# Altium footprint library mastermind.PCBLIB: 1061 footprints (part 39 of 67)
Each footprint in its own frame and in the unit in brackets; x right, y up, seen from the top. Pads: shape width x height; smd on the part's side, far side on the other; paste and mask are expansions set on the pad; w line width, h text height; cw(c..) or ccw(c..) is an arc to the next point about the centre after c.
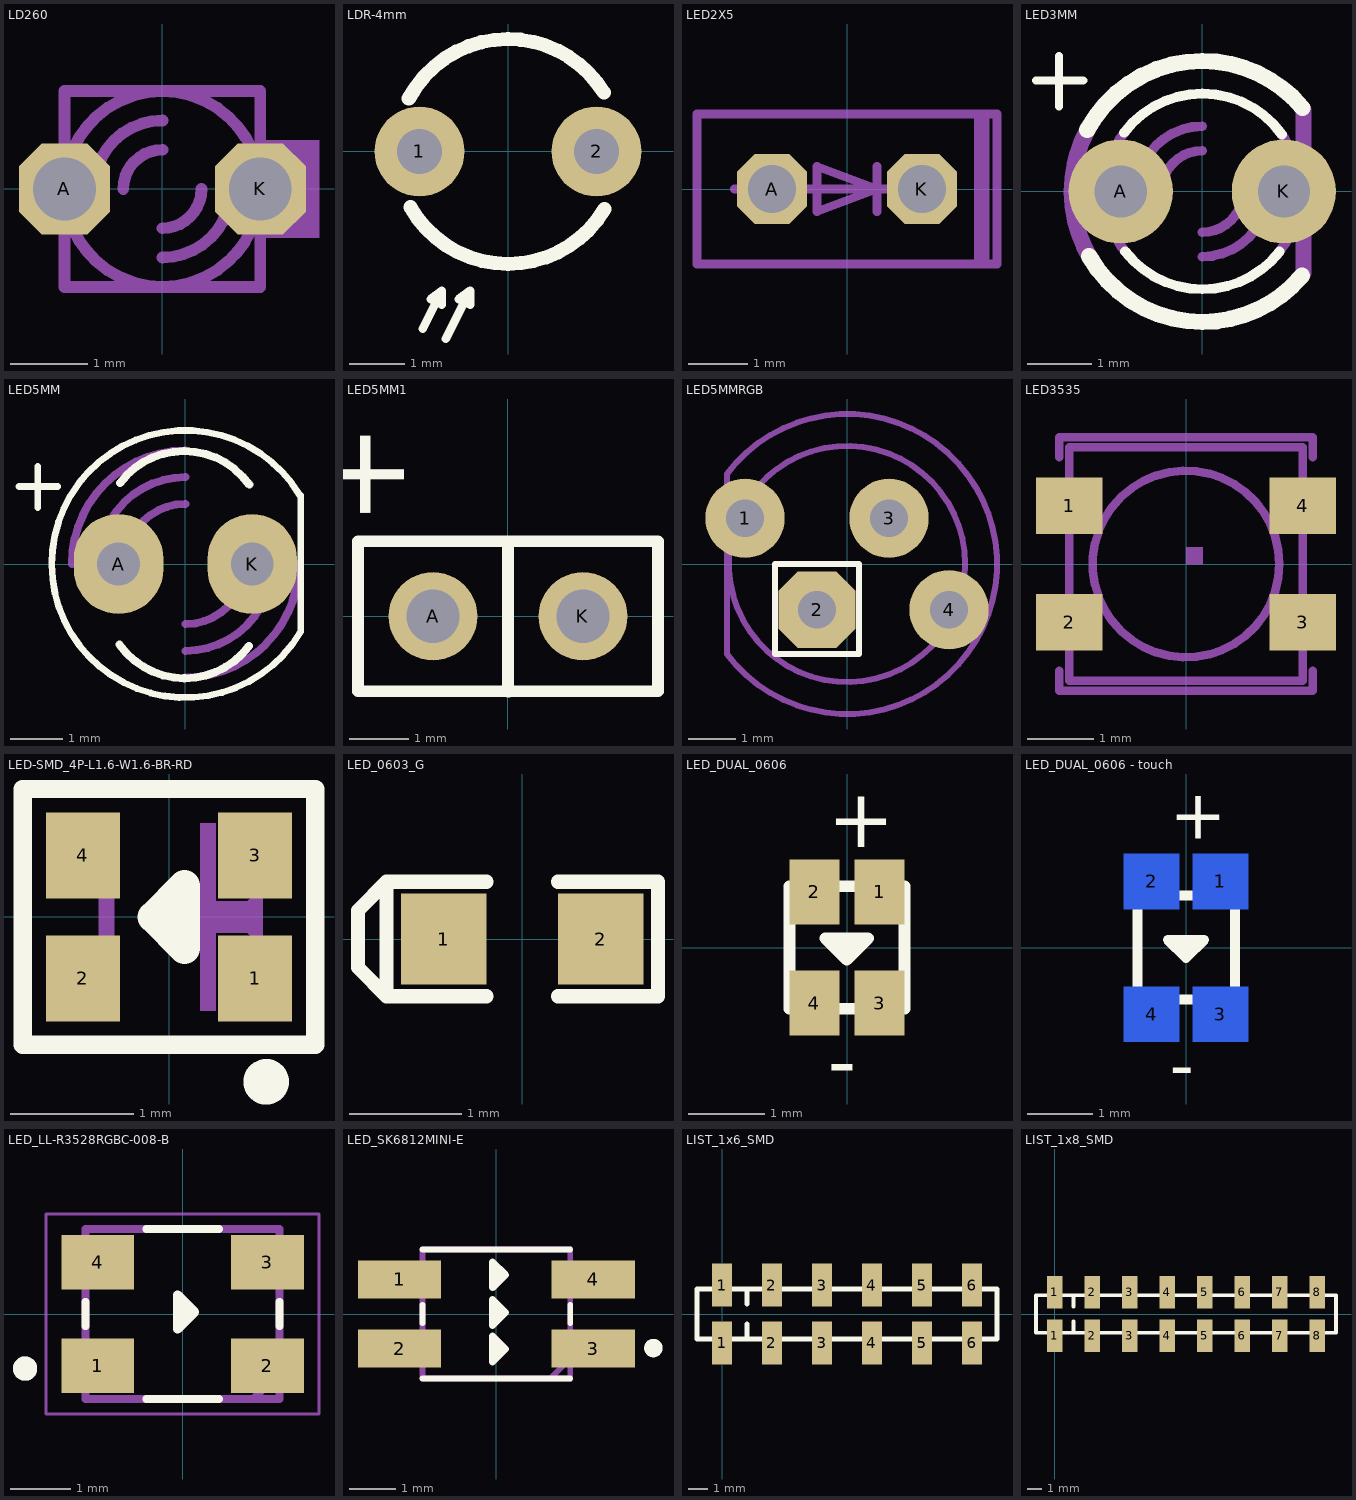
[diagram p38: the footprints below, top view; thin cyan lines are the x and y axes]

## LD260 [mil]
pads (2):
  oct 46.48x46.48 hole 32: A(-50,0) K(50,0)
Mechanical 2:
  region: 75,-25 75,25 80,25 80,-25
  lines w6: -50,-35 -50,-50 50,-50 50,-35 ; -50,35 -50,50 50,50 50,35 ; -39.04,-31.24 ccw(c0,-0.01) 0,-50 ccw(c0,-0.01) 39.04,-31.24 ; -39.04,31.24 cw(c0,0.01) 0,50 cw(c0,0.01) 39.04,31.24 ; 0,-20 ccw(c0,0) 20,0
Mechanical 8:
  region: 50,-25 50,25 80,25 80,-25
  lines w6: -50,-35 -50,35 ; -37.96,-32.54 cw(c0,0) -50,0 cw(c0,0) -37.96,32.54 ; -35,0 cw(c0,0) 0,35 ; -20,0 cw(c0,0) 0,20 ; 0,-35 ccw(c0,0) 35,0 ; 37.63,-32.93 ccw(c-0.01,0) 50,0 ccw(c0,0) 38.41,32.01 ; 50,-35 50,35

## LDR-4mm [mm]
pads (2):
  round 1.623 hole 0.813: 1(-1.6,0) 2(1.6,0)
Top Overlay:
  lines w0.152: -1.539,-3.205 -1.194,-2.515 ; -1.123,-3.388 -0.686,-2.515 ; -1.194,-2.515 -1.397,-2.667 -1.194,-2.769 -1.194,-2.515 ; -0.686,-2.515 -0.686,-2.769 -0.889,-2.667 -0.686,-2.515
  lines w0.254: -1.793,0.956 cw(c0,0) 0,2.032 cw(c0,0) 1.732,1.064 ; -1.764,-1.008 ccw(c0,0) 0,-2.032 ccw(c0,0) 1.745,-1.042

## LED2X5 [mil]
pads (2):
  oct 46.48x46.48 hole 32: A(-50,0) K(50,0)
Mechanical 2:
  region: 85,-50 85,50 95,50 95,-50
  lines w6: -100,-50 100,-50 100,50 -100,50 -100,-50
Mechanical 8:
  lines w6: -75,0 20,0 ; 20,-15 20,0 ; 20,15 20,0 ; 70,0 20,0 ; 20,0 -20,15 -20,-15 20,0

## LED3MM [mil]
pads (2):
  round 63.9 hole 32: A(-50,0) K(50,0)
Top Overlay:
  lines w5: -102,68 -73,68 ; -88,52 -88,83
  lines w6: -48,36 cw(c0,0) 0,60 cw(c-0.01,0) 48.82,34.87 ; -47.36,-36.83 ccw(c0.01,0) 0,-60 ccw(c-0.01,0) 47.36,-36.83
  lines w10: -70.59,37.65 cw(c0,0) 0,80 cw(c0.01,0) 61.46,51.22 ; -69.46,-39.69 ccw(c0,0) 0,-80 ccw(c0,0) 61.07,-51.68
Mechanical 8:
  lines w6: -46.09,38.41 ccw(c0,-0.01) -60,0 ccw(c0,-0.01) -44.85,-39.86 ; -40,0 cw(c0,0) 0,40 ; -25,0 cw(c0,0) 0,25 ; 0,-40 ccw(c0,0) 40,0 ; 0,-25 ccw(c0,0) 25,0 ; 45.56,39.05 cw(c0,0.01) 60,0 cw(c0,0.01) 46.09,-38.41
  lines w10: -70.44,37.93 ccw(c0,0.01) -80,0 ccw(c0,0) -68.13,-41.93 ; 62,-50 62,50

## LED5MM [mm]
pads (2):
  oval 1.7x1.9 hole 0.813: A(-1.27,0) K(1.27,0)
Top Overlay:
  lines w0.127: -3.162,1.473 -2.426,1.473 ; -2.807,1.067 -2.807,1.854 ; 2.185,1.305 2.191,1.305 ; 2.191,1.305 2.191,-1.285 cw(c0,0) 2.179,1.305 2.191,1.305
  lines w0.152: -1.253,-1.533 ccw(c-0.013,-0.648) -0.013,-2.172 ccw(c-0.013,-0.648) 1.206,-1.562 ; -1.245,1.537 cw(c-0.025,0.622) -0.025,2.146 cw(c-0.026,0.622) 1.215,1.508
Mechanical 8:
  lines w0.152: -2.159,0 cw(c0,0) 0,2.159 ; -1.651,0 cw(c0,0) 0,1.651 ; -1.143,0 cw(c0,0) 0,1.143 ; 0,-2.159 ccw(c0,0) 2.159,0 ; 0,-1.651 ccw(c0,0) 1.651,0 ; 0,-1.143 ccw(c0,0) 1.143,0

## LED5MM1 [mm]
pads (2):
  round 1.5 hole 0.9: A(-1.27,0) K(1.27,0)
Top Overlay:
  lines w0.2: 0,1.27 0,-1.277 0.011,-1.277 ; -2.54,-1.27 -2.54,1.27 2.54,1.27 2.54,-1.27 -2.54,-1.27
  text "+" at -1.759,1.524 h1.52

## LED5MMRGB [mil]
pads (4):
  round 66 hole 31.5: 1(-85,38.13) 3(35,38.13) 4(85,-38.13)
  oct 63.9x63.9 hole 31.5: 2(-25,-38.13)
Top Overlay:
  lines w5: -60,-75 -60,0 10,0 10,-75 -60,-75
Mechanical 2:
  circle w5: c0,0 r98.43
  lines w5: -100,-75 ccw(c0,0) -100,75 -100,-75

## LED3535 [mm]
pads (4):
  rect 1x0.85 smd: 1(-1.75,0.875) 2(-1.75,-0.875) 3(1.75,-0.875) 4(1.75,0.875)
Mechanical 2:
  region: 0,0 0.254,0 0.254,0.254 0,0.254
  lines w0.127: -1.9,-1.6 -1.9,-1.9 1.9,-1.9 1.9,-1.6 ; -1.9,1.6 -1.9,1.9 1.9,1.9 1.9,1.6
Mechanical 8:
  circle w0.127: c0,0 r1.4
  lines w0.127: -1.75,-1.75 1.75,-1.75 1.75,1.75 -1.75,1.75 -1.75,-1.75

## LED-SMD_4P-L1.6-W1.6-BR-RD [mm]
pads (4):
  rect 0.6x0.7 smd: 1(0.7,-0.5) 2(-0.7,-0.5) 3(0.7,0.5) 4(-0.7,0.5)
Top Overlay:
  circle w0.254: c0.79,-1.34 r0.058
  lines w0.15: -1.19,-1.04 1.19,-1.04 1.19,1.04 -1.19,1.04 -1.19,-1.04
  lines w0.254: -0.127,0 0.127,0.254 0.127,-0.254 -0.127,0
Mechanical 15:
  region: 0.254,0.762 0.254,-0.762 0.381,-0.762 0.381,-0.127 0.635,-0.127 0.762,-0.254 0.762,0.254 0.635,0.127 0.381,0.127 0.381,0.762
  region: -0.572,0.762 -0.445,0.762 -0.445,-0.762 -0.572,-0.762

## LED_0603_G [mil]
pads (2):
  rect 30x32 smd: 1(-27.5,0) 2(27.5,0)
Top Overlay:
  lines w5: -12.5,-20 -47.5,-20 ; -12.5,20 -47.5,20 ; 12.5,-20 47.5,-20 47.5,20 12.5,20 ; -47.5,-20 -57.5,-10 -57.5,10 -47.5,20 ; -47.5,-20 -47.5,20
3D body "User Library-led_0603_green.step": height 23.62, standoff 0, extent -31.63,-15.75 32.15,15.75

## LED_DUAL_0606 [mm]
pads (4):
  rect 0.65x0.85 smd paste+0: 1(0.425,0.725) 2(-0.425,0.725) 3(0.425,-0.725) 4(-0.425,-0.725)
Top Overlay:
  region: -0.285,0.12 -0.005,-0.16 0.275,0.12
  lines w0.15: -0.75,-0.8 0.75,-0.8 ; -0.75,0.8 0.75,0.8
  lines w0.152: -0.75,-0.8 -0.75,0.8 ; 0.75,-0.8 0.75,0.8 ; -0.285,0.12 0.275,0.12 -0.005,-0.16 -0.285,0.12
  text "+" at -0.254,1.305 h0.76
  text "-" at -0.254,-1.845 h0.76
3D body: height 0.36, standoff 0.18, extent 0.235,-0.15 0.535,0.15
3D body: height 0.55, standoff 0.18, extent -0.75,-0.55 0.75,0.55
3D body: height 0.18, standoff 0, extent -0.75,-0.8 0.75,0.8
3D body: height 0.36, standoff 0.18, extent -0.525,-0.15 -0.225,0.15

## LED_DUAL_0606 - touch [mm]
pads (4):
  rect 0.85x0.85 smd far side paste+0: 1(0.525,1.015) 2(-0.535,1.015) 3(0.525,-1.025) 4(-0.535,-1.025)
Top Overlay:
  region: -0.285,0.12 -0.005,-0.16 0.275,0.12
  lines w0.15: -0.75,-0.8 0.75,-0.8 ; -0.75,0.8 0.75,0.8
  lines w0.152: -0.75,-0.8 -0.75,0.8 ; 0.75,-0.8 0.75,0.8 ; -0.285,0.12 0.275,0.12 -0.005,-0.16 -0.285,0.12
  text "+" at -0.254,1.675 h0.76
  text "-" at -0.254,-2.175 h0.76
3D body: height 0.36, standoff 0.18, extent 0.235,-0.15 0.535,0.15
3D body: height 0.55, standoff 0, extent -0.75,-0.55 0.75,0.55
3D body: height 0.18, standoff 0, extent -0.75,-0.8 0.75,0.8
3D body: height 0.36, standoff 0.18, extent -0.525,-0.15 -0.225,0.15

## LED_LL-R3528RGBC-008-B [mm]
pads (4):
  rect 1.2x0.9 smd: 1(-1.4,-0.85) 2(1.4,-0.85) 3(1.4,0.85) 4(-1.4,0.85)
Top Overlay:
  circle w0.2: c-2.597,-0.9 r0.1
  region: -0.082,-0.247 0.198,0.033 -0.082,0.313
  lines w0.127: -1.6,-0.2 -1.6,0.2 ; -0.6,-1.4 0.6,-1.4 ; -0.6,1.4 0.6,1.4 ; 1.6,-0.2 1.6,0.2
  lines w0.152: -0.082,-0.247 -0.082,0.313 0.198,0.033 -0.082,-0.247
Mechanical 13:
  circle w0.2: c-2.597,-0.9 r0.1
  lines w0.127: 1.17,-1.4 1.6,-1.4 1.6,-0.96 ; 1.17,-1.4 -1.6,-1.4 -1.6,1.4 1.6,1.4 1.6,-0.96 ; 1.17,-1.4 1.6,-0.96
Mechanical 15:
  lines w0.05: -2.25,-1.65 -2.25,1.65 2.25,1.65 2.25,-1.65 -2.25,-1.65

## LED_SK6812MINI-E [mm]
pads (4):
  rect 1.8x0.82 smd: 1(-2.1,0.75) 2(-2.1,-0.75) 3(2.1,-0.75) 4(2.1,0.75)
Top Overlay:
  circle w0.2: c3.404,-0.738 r0.1
  region: -0.082,-1.04 0.198,-0.76 -0.082,-0.48
  region: -0.082,0.57 0.198,0.85 -0.082,1.13
  region: -0.082,-0.247 0.198,0.033 -0.082,0.313
  lines w0.127: -1.6,-1.4 1.6,-1.4 ; -1.6,-0.2 -1.6,0.2 ; -1.6,1.4 1.6,1.4 ; 1.6,-0.2 1.6,0.2
  lines w0.152: -0.082,-1.04 0.198,-0.76 -0.082,-0.48 -0.082,-1.04 ; -0.082,-0.247 0.198,0.033 -0.082,0.313 -0.082,-0.247 ; -0.082,0.57 0.198,0.85 -0.082,1.13 -0.082,0.57
Mechanical 13:
  circle w0.2: c-2.597,-0.9 r0.1
  lines w0.127: 1.17,-1.4 1.6,-0.96 ; 1.17,-1.4 -1.6,-1.4 -1.6,1.4 1.6,1.4 1.6,-0.96 ; 1.17,-1.4 1.6,-1.4 1.6,-0.96

## LIST_1x6_SMD [mm]
pads (12):
  rect 1.02x2.19 smd: 1(0,-1.465) 1(0,1.465) 2(2.54,-1.465) 2(2.54,1.465) 3(5.08,-1.465) 3(5.08,1.465) 4(7.62,-1.465) 4(7.62,1.465) 5(10.16,-1.465) 5(10.16,1.465) 6(12.7,-1.465) 6(12.7,1.465)
Top Overlay:
  lines w0.254: 1.27,-1.27 1.27,-0.508 ; 1.27,0.508 1.27,1.27 ; -1.27,-1.27 -1.27,1.27 13.97,1.27 13.97,-1.27 -1.27,-1.27

## LIST_1x8_SMD [mm]
pads (16):
  rect 1.02x2.19 smd: 1(0,-1.465) 1(0,1.465) 2(2.54,-1.465) 2(2.54,1.465) 3(5.08,-1.465) 3(5.08,1.465) 4(7.62,-1.465) 4(7.62,1.465) 5(10.16,-1.465) 5(10.16,1.465) 6(12.7,-1.465) 6(12.7,1.465) 7(15.24,-1.465) 7(15.24,1.465) 8(17.78,-1.465) 8(17.78,1.465)
Top Overlay:
  lines w0.254: 1.27,-1.27 1.27,-0.508 ; 1.27,0.508 1.27,1.27 ; -1.27,-1.27 -1.27,1.27 19.05,1.27 19.05,-1.27 -1.27,-1.27
3D body "pin_header_a-sl254-eg-g08mp1.stp": height 9.82, standoff -0.02, extent -1.27,-2.5 19.05,2.5